# Altium footprint library Atlan.PcbLib: 283 footprints (part 6 of 18)
Each footprint in its own frame and in the unit in brackets; x right, y up, seen from the top. Pads: shape width x height; smd on the part's side, far side on the other; paste and mask are expansions set on the pad; w line width, h text height; cw(c..) or ccw(c..) is an arc to the next point about the centre after c.
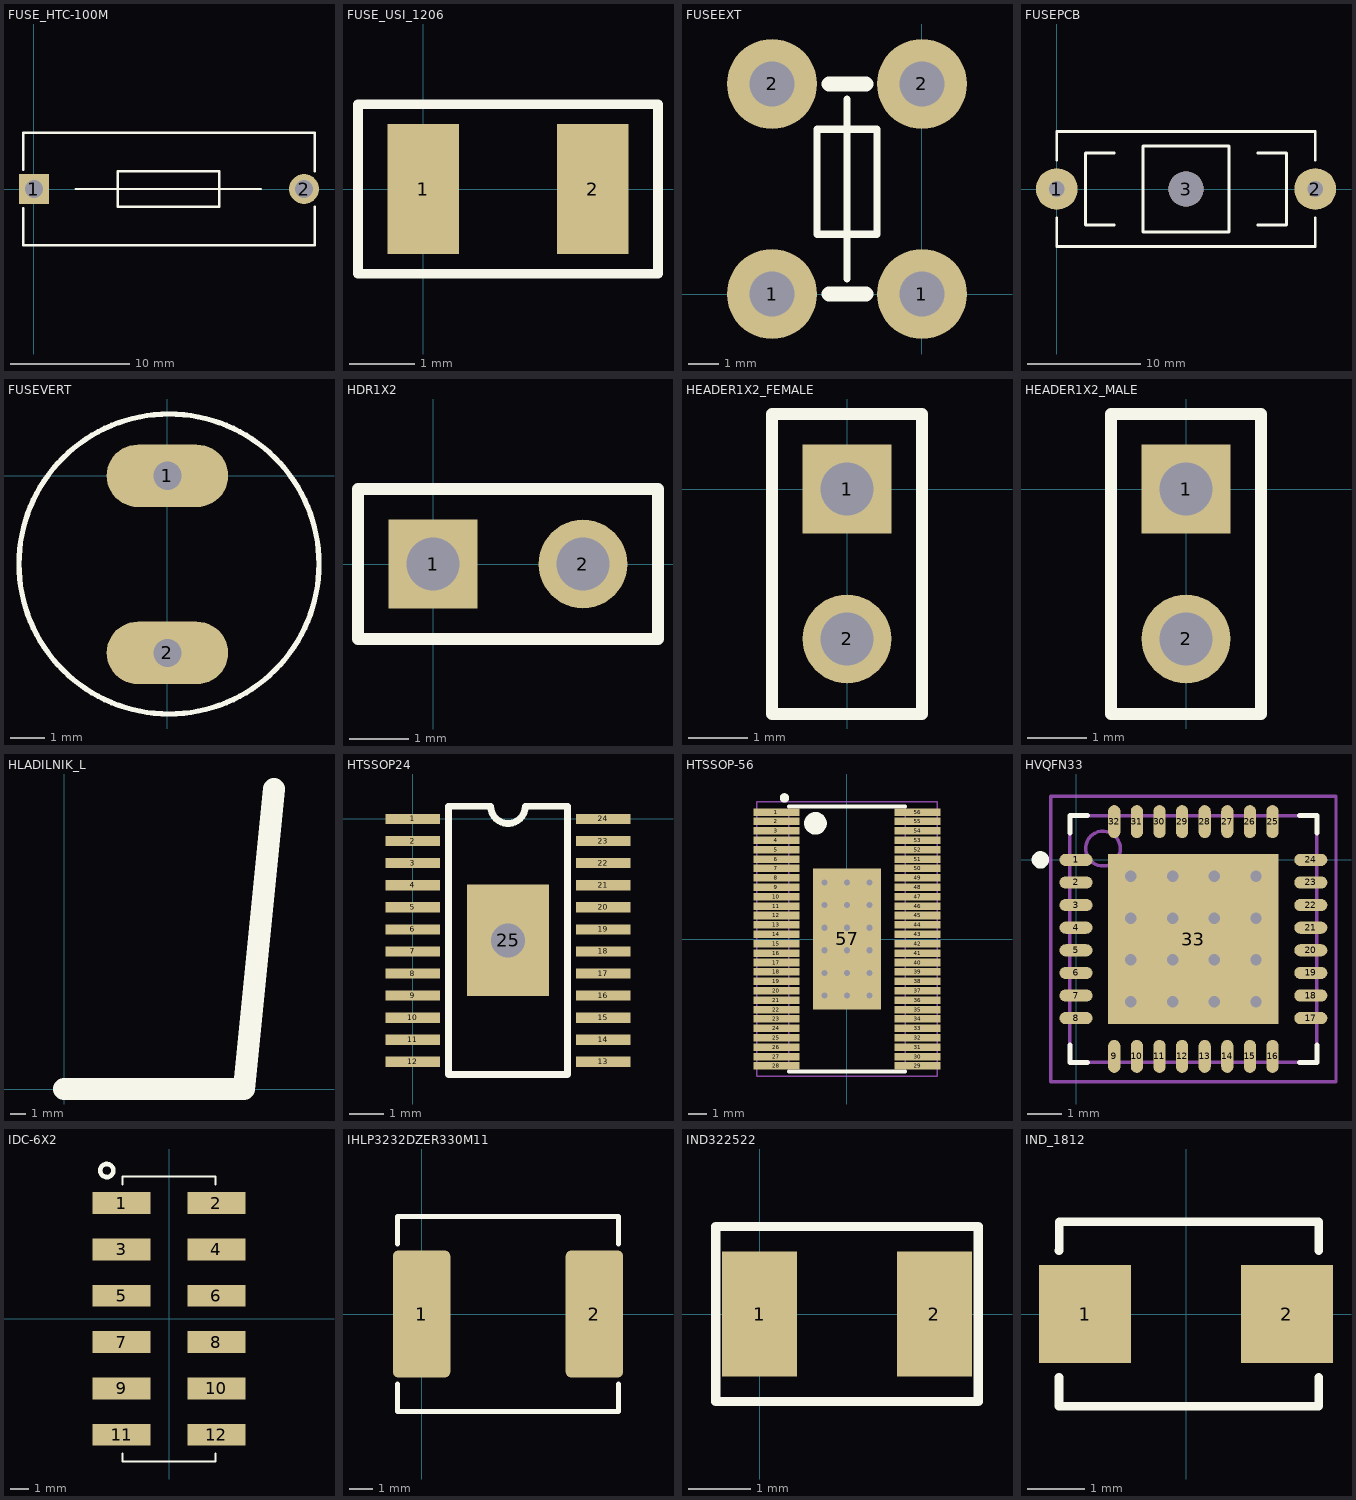
[diagram p5: the footprints below, top view; thin cyan lines are the x and y axes]

## FUSE_HTC-100M [mm]
height 12.5
pads (2):
  rect 2.5x2.5 hole 1.5: 1(0,0)
  round 2.5 hole 1.5: 2(22.6,0)
Top Overlay:
  lines w0.2: -0.9,-1.6 -0.9,-4.7 23.5,-4.7 23.5,-1.5 ; -0.9,1.6 -0.9,4.7 23.5,4.7 23.5,1.5 ; 3.5,0 19,0 ; 7,-1.5 7,1.5 15.5,1.5 15.5,-1.5 7,-1.5

## FUSE_USI_1206 [mm]
pads (2):
  rect 1.1x2 smd: 1(0,0) 2(2.6,0)
Top Overlay:
  lines w0.15: -1,-1.3 3.6,-1.3 3.6,1.3 -1,1.3 -1,-1.3

## FUSEEXT [mm]
pads (4):
  round 3 hole 1.5: 1(-5,0) 1(0,0) 2(-5,7) 2(0,7)
Top Overlay:
  lines w0.25: -2.5,0.5 -2.5,6.5 ; -3.5,2 -1.5,2 -1.5,5.5 -3.5,5.5 -3.5,2
  lines w0.5: -3.1,0 -1.875,0 ; -3.1,7 -1.875,7
3D body "Faston PCB TAB 4_8x0_8x13_5.STEP": height 9, standoff -4.8, extent -5.65,-0.4 0.65,0.4
3D body "Faston PCB TAB 4_8x0_8x13_5.STEP": height 9, standoff -4.8, extent -5.65,6.6 0.65,7.4

## FUSEPCB [mil] "F?"
pads (3):
  round 145 hole 55: 1(0,0) 2(900,0)
  round 122 hole 122: 3(450,0)
Top Overlay:
  lines w10: 0,-100 0,-200 900,-200 900,-100 ; 0,100 0,200 900,200 900,100 ; 200,-125 100,-125 100,125 200,125 ; 700,-125 800,-125 800,125 700,125 ; 300,-150 300,150 600,150 600,-150 300,-150

## FUSEVERT [mm]
pads (2):
  oval 3.5x1.8 hole 0.81: 1(0,0) 2(0,-5.1)
Bottom Layer:
  lines w0.813: 0.005,-5.039 0.046,-5.08
Top Overlay:
  lines w0.152: -4.272,-2.54 -4.267,-2.751 -4.252,-2.964 -4.227,-3.172 -4.188,-3.383 -4.143,-3.589 -4.087,-3.792 -4.021,-3.995 -3.945,-4.194 -3.858,-4.387 -3.762,-4.575 -3.658,-4.76 -3.543,-4.938 -3.421,-5.113 -3.292,-5.278 -3.155,-5.441 -3.007,-5.593 -2.855,-5.74 -2.692,-5.878 -2.527,-6.007 -2.352,-6.129 -2.174,-6.243 -1.989,-6.347 -1.801,-6.444 -1.608,-6.53 -1.41,-6.607 -1.206,-6.673 -1.003,-6.728 -0.798,-6.774 -0.587,-6.812 -0.378,-6.838 -0.165,-6.853 0.046,-6.858 0.257,-6.853 0.47,-6.838 0.678,-6.812 0.889,-6.774 1.095,-6.728 1.298,-6.673 1.501,-6.607 1.699,-6.53 1.892,-6.444 2.08,-6.347 2.266,-6.243 2.443,-6.129 2.619,-6.007 2.784,-5.878 2.946,-5.74 3.099,-5.593 3.246,-5.441 3.383,-5.278 3.513,-5.113 3.635,-4.938 3.749,-4.76 3.853,-4.575 3.95,-4.387 4.036,-4.194 4.112,-3.995 4.178,-3.792 4.234,-3.589 4.28,-3.383 4.318,-3.172 4.343,-2.964 4.359,-2.751 4.364,-2.54 4.359,-2.329 4.343,-2.116 4.318,-1.908 4.28,-1.697 4.234,-1.491 4.178,-1.288 4.112,-1.085 4.036,-0.886 3.95,-0.693 3.853,-0.505 3.749,-0.32 3.635,-0.142 3.513,0.033 3.383,0.198 3.246,0.361 3.099,0.513 2.946,0.66 2.784,0.798 2.619,0.927 2.443,1.049 2.266,1.163 2.08,1.267 1.892,1.364 1.699,1.45 1.501,1.527 1.298,1.593 1.095,1.648 0.889,1.694 0.678,1.732 0.47,1.758 0.257,1.773 0.046,1.778 -0.165,1.773 -0.378,1.758 -0.587,1.732 -0.798,1.694 -1.003,1.648 -1.206,1.593 -1.41,1.527 -1.608,1.45 -1.801,1.364 -1.989,1.267 -2.174,1.163 -2.352,1.049 -2.527,0.927 -2.692,0.798 -2.855,0.66 -3.007,0.513 -3.155,0.361 -3.292,0.198 -3.421,0.033 -3.543,-0.142 -3.658,-0.32 -3.762,-0.505 -3.858,-0.693 -3.945,-0.886 -4.021,-1.085 -4.087,-1.288 -4.143,-1.491 -4.188,-1.697 -4.227,-1.908 -4.252,-2.116 -4.267,-2.329 -4.272,-2.54

## HDR1X2 [mm] "Connector; Header; 2 Position"
pads (2):
  rect 1.5x1.5 hole 0.9: 1(0,0)
  round 1.5 hole 0.9: 2(2.54,0)
Top Overlay:
  lines w0.2: -1.27,-1.27 3.81,-1.27 3.81,1.27 -1.27,1.27 -1.27,-1.27

## HEADER1X2_FEMALE [mm]
height 8.5
pads (2):
  rect 1.5x1.5 hole 0.9: 1(0,0)
  round 1.5 hole 0.9: 2(0,-2.54)
Top Overlay:
  lines w0.2: -1.27,-3.81 1.27,-3.81 1.27,1.27 -1.27,1.27 -1.27,-3.81
3D body "female_header_a-bl254-eg-g02d.stp": height 8.5, standoff -3.2, extent -1.25,-3.965 1.25,1.365

## HEADER1X2_MALE [mm]
height 10
pads (2):
  rect 1.5x1.5 hole 0.9: 1(0,0)
  round 1.5 hole 0.9: 2(0,-2.54)
Top Overlay:
  lines w0.2: -1.27,-3.81 -1.27,1.27 1.27,1.27 1.27,-3.81 -1.27,-3.81
3D body "Pin Header 1x2 TH Pitch 2.54mm.stp": height 9.5, standoff -3.2, extent -1.27,-3.81 1.27,1.27

## HLADILNIK_L [mm]
Top Overlay:
  lines w1.5: 0,0 12,0 14,20
3D body: height 38, standoff 0, extent -0.7,-0.8 14.8,20.8

## HTSSOP24 [mm] "IC"
pads (25):
  rect 1.6x0.3 smd: 1(0,0) 2(0,-0.65) 3(0,-1.3) 4(0,-1.95) 5(0,-2.6) 6(0,-3.25) 7(0,-3.9) 8(0,-4.55) 9(0,-5.2) 10(0,-5.85) 11(0,-6.5) 12(0,-7.15) 13(5.6,-7.15) 14(5.6,-6.5) 15(5.6,-5.85) 16(5.6,-5.2) 17(5.6,-4.55) 18(5.6,-3.9) 19(5.6,-3.25) 20(5.6,-2.6) 21(5.6,-1.95) 22(5.6,-1.3) 23(5.6,-0.65) 24(5.6,0)
  rect 2.4x3.28 hole 1: 25(2.8,-3.575)
Top Overlay:
  lines w0.2: 1.05,-7.525 1.05,0.375 2.292,0.375 ccw(c2.8,0.375) 3.308,0.375 4.55,0.375 4.55,-7.525 1.05,-7.525

## HTSSOP-56 [mm] "TSSOP, 56-Leads, Body 14,1x6,2mm (max), Pitch 0,50mm, IPC Medium Density"
height 1.2
pads (57):
  rect 2.45x0.4 smd: 1(-3.75,6.75) 2(-3.75,6.25) 3(-3.75,5.75) 4(-3.75,5.25) 5(-3.75,4.75) 6(-3.75,4.25) 7(-3.75,3.75) 8(-3.75,3.25) 9(-3.75,2.75) 10(-3.75,2.25) 11(-3.75,1.75) 12(-3.75,1.25) 13(-3.75,0.75) 14(-3.75,0.25) 15(-3.75,-0.25) 16(-3.75,-0.75) 17(-3.75,-1.25) 18(-3.75,-1.75) 19(-3.75,-2.25) 20(-3.75,-2.75) 21(-3.75,-3.25) 22(-3.75,-3.75) 23(-3.75,-4.25) 24(-3.75,-4.75) 25(-3.75,-5.25) 26(-3.75,-5.75) 27(-3.75,-6.25) 28(-3.75,-6.75) 29(3.75,-6.75) 30(3.75,-6.25) 31(3.75,-5.75) 32(3.75,-5.25) 33(3.75,-4.75) 34(3.75,-4.25) 35(3.75,-3.75) 36(3.75,-3.25) 37(3.75,-2.75) 38(3.75,-2.25) 39(3.75,-1.75) 40(3.75,-1.25) 41(3.75,-0.75) 42(3.75,-0.25) 43(3.75,0.25) 44(3.75,0.75) 45(3.75,1.25) 46(3.75,1.75) 47(3.75,2.25) 48(3.75,2.75) 49(3.75,3.25) 50(3.75,3.75) 51(3.75,4.25) 52(3.75,4.75) 53(3.75,5.25) 54(3.75,5.75) 55(3.75,6.25) 56(3.75,6.75)
  rect 3.6x7.5 smd: 57(0,0)
via -1.2,3 diameter 0.66 hole 0.33
via 0,3 diameter 0.66 hole 0.33
via 1.2,3 diameter 0.66 hole 0.33
via -1.2,1.8 diameter 0.66 hole 0.33
via 0,1.8 diameter 0.66 hole 0.33
via 1.2,1.8 diameter 0.66 hole 0.33
via -1.2,0.6 diameter 0.66 hole 0.33
via 0,0.6 diameter 0.66 hole 0.33
via 1.2,0.6 diameter 0.66 hole 0.33
via -1.2,-0.6 diameter 0.66 hole 0.33
via 0,-0.6 diameter 0.66 hole 0.33
via 1.2,-0.6 diameter 0.66 hole 0.33
via -1.2,-1.8 diameter 0.66 hole 0.33
via 0,-1.8 diameter 0.66 hole 0.33
via 1.2,-1.8 diameter 0.66 hole 0.33
via -1.2,-3 diameter 0.66 hole 0.33
via 0,-3 diameter 0.66 hole 0.33
via 1.2,-3 diameter 0.66 hole 0.33
Top Overlay:
  circle w0.25: c-3.325,7.5 r0.125
  circle w0.6: c-1.675,6.15 r0.3
  lines w0.2: -3.1,-7.05 3.1,-7.05 ; -3.1,7.05 3.1,7.05
Mechanical 13:
  circle w0.1: c-1.675,6.15 r0.5
  lines w0.1: -3.1,-7.05 -3.1,7.05 3.1,7.05 3.1,-7.05 -3.1,-7.05
Mechanical 15:
  lines w0.1: -0.5,0 0.5,0 ; 0,-0.5 0,0.5 ; -4.8,-7.3 -4.8,7.3 4.8,7.3 4.8,-7.3 -4.8,-7.3
3D body: height 1.2, standoff 0.25, extent -3.1,-7.05 3.1,7.05
3D body "User Library-HTSSOP-56.STEP": height 1.1, standoff 0, extent -4,-7 4.2,7

## HVQFN33 [mm] "QFN, 32-Leads, Body 7,1x7,1mm (max), Pitch 0,65mm, IPC Medium Density"
height 1
pads (33):
  oval 0.95x0.35 smd: 1(0,0) 2(0,-0.65) 3(0,-1.3) 4(0,-1.95) 5(0,-2.6) 6(0,-3.25) 7(0,-3.9) 8(0,-4.55) 17(6.75,-4.55) 18(6.75,-3.9) 19(6.75,-3.25) 20(6.75,-2.6) 21(6.75,-1.95) 22(6.75,-1.3) 23(6.75,-0.65) 24(6.75,0)
  oval 0.35x0.95 smd: 9(1.1,-5.65) 10(1.75,-5.65) 11(2.4,-5.65) 12(3.05,-5.65) 13(3.7,-5.65) 14(4.35,-5.65) 15(5,-5.65) 16(5.65,-5.65) 25(5.65,1.1) 26(5,1.1) 27(4.35,1.1) 28(3.7,1.1) 29(3.05,1.1) 30(2.4,1.1) 31(1.75,1.1) 32(1.1,1.1)
  rect 4.9x4.9 smd: 33(3.375,-2.275)
via 1.575,-0.475 diameter 0.66 hole 0.33
via 2.775,-0.475 diameter 0.66 hole 0.33
via 3.975,-0.475 diameter 0.66 hole 0.33
via 5.175,-0.475 diameter 0.66 hole 0.33
via 1.575,-1.675 diameter 0.66 hole 0.33
via 2.775,-1.675 diameter 0.66 hole 0.33
via 3.975,-1.675 diameter 0.66 hole 0.33
via 5.175,-1.675 diameter 0.66 hole 0.33
via 1.575,-2.875 diameter 0.66 hole 0.33
via 2.775,-2.875 diameter 0.66 hole 0.33
via 3.975,-2.875 diameter 0.66 hole 0.33
via 5.175,-2.875 diameter 0.66 hole 0.33
via 1.575,-4.075 diameter 0.66 hole 0.33
via 2.775,-4.075 diameter 0.66 hole 0.33
via 3.975,-4.075 diameter 0.66 hole 0.33
via 5.175,-4.075 diameter 0.66 hole 0.33
Top Overlay:
  circle w0.25: c-1.025,0 r0.125
  lines w0.15: -0.175,-5.325 -0.175,-5.825 0.325,-5.825 ; -0.175,0.775 -0.175,1.275 0.325,1.275 ; 6.425,-5.825 6.925,-5.825 6.925,-5.325 ; 6.425,1.275 6.925,1.275 6.925,0.775
Mechanical 13:
  circle w0.1: c0.775,0.325 r0.5
  lines w0.1: -0.175,-5.825 -0.175,1.275 6.925,1.275 6.925,-5.825 -0.175,-5.825
Mechanical 15:
  lines w0.1: 2.875,-2.275 3.875,-2.275 ; 3.375,-2.775 3.375,-1.775 ; -0.725,-6.375 -0.725,1.825 7.475,1.825 7.475,-6.375 -0.725,-6.375
3D body: height 1, standoff 0.05, extent -0.175,-5.825 6.925,1.275

## IDC-6X2 [mm]
pads (12):
  rect 3.2x1.2 smd: 1(-2.6,6.35) 2(2.6,6.35) 3(-2.6,3.81) 4(2.6,3.81) 5(-2.6,1.27) 6(2.6,1.27) 7(-2.6,-1.27) 8(2.6,-1.27) 9(-2.6,-3.81) 10(2.6,-3.81) 11(-2.6,-6.35) 12(2.6,-6.35)
Top Overlay:
  circle w0.254: c-3.407,8.128 r0.359
  lines w0.1: -2.54,-7.366 -2.54,-7.81 2.54,-7.81 2.54,-7.366 ; -2.54,7.366 -2.54,7.81 2.54,7.81 2.54,7.366
3D body "BG050-16X-0-1400-0320-1100-X-X_revE1.STEP": height 9.94, standoff -0.06, extent -2.9,-7.62 2.88,7.62

## IHLP3232DZER330M11 [mil] "Inductor case"
pads (2):
  rrect20% 95x210 smd: 1(0,0) 2(285,0)
Top Overlay:
  lines w8: -40,-115 -40,-161.02 325,-161.02 325,-115 ; -40,115 -40,161.02 325,161.02 325,115

## IND322522 [mm] "Inductor"
pads (2):
  rect 1.2x2 smd: 1(0,0) 2(2.8,0)
Top Overlay:
  lines w0.15: -0.7,-1.4 -0.7,1.4 3.5,1.4 3.5,-1.4 -0.7,-1.4
3D body: height 3, standoff 0, extent -0.5,-1.1 3.3,1.1

## IND_1812 [mm]
height 3.8
pads (2):
  rrect1% 1.6x1.7 smd: 1(-1.75,0) 2(1.75,0)
Top Overlay:
  lines w0.15: -2.2,-1.1 -2.2,-1.6 2.3,-1.6 2.3,-1.1 ; 2.3,1.1 2.3,1.6 -2.2,1.6 -2.2,1.1 ; -2.2,1.1 -2.2,1.1 ; 2.3,-1.1 2.3,-1.1